# Altium footprint library IC.PcbLib: 68 footprints (part 3 of 5)
Each footprint in its own frame and in the unit in brackets; x right, y up, seen from the top. Pads: shape width x height; smd on the part's side, far side on the other; paste and mask are expansions set on the pad; w line width, h text height; cw(c..) or ccw(c..) is an arc to the next point about the centre after c.
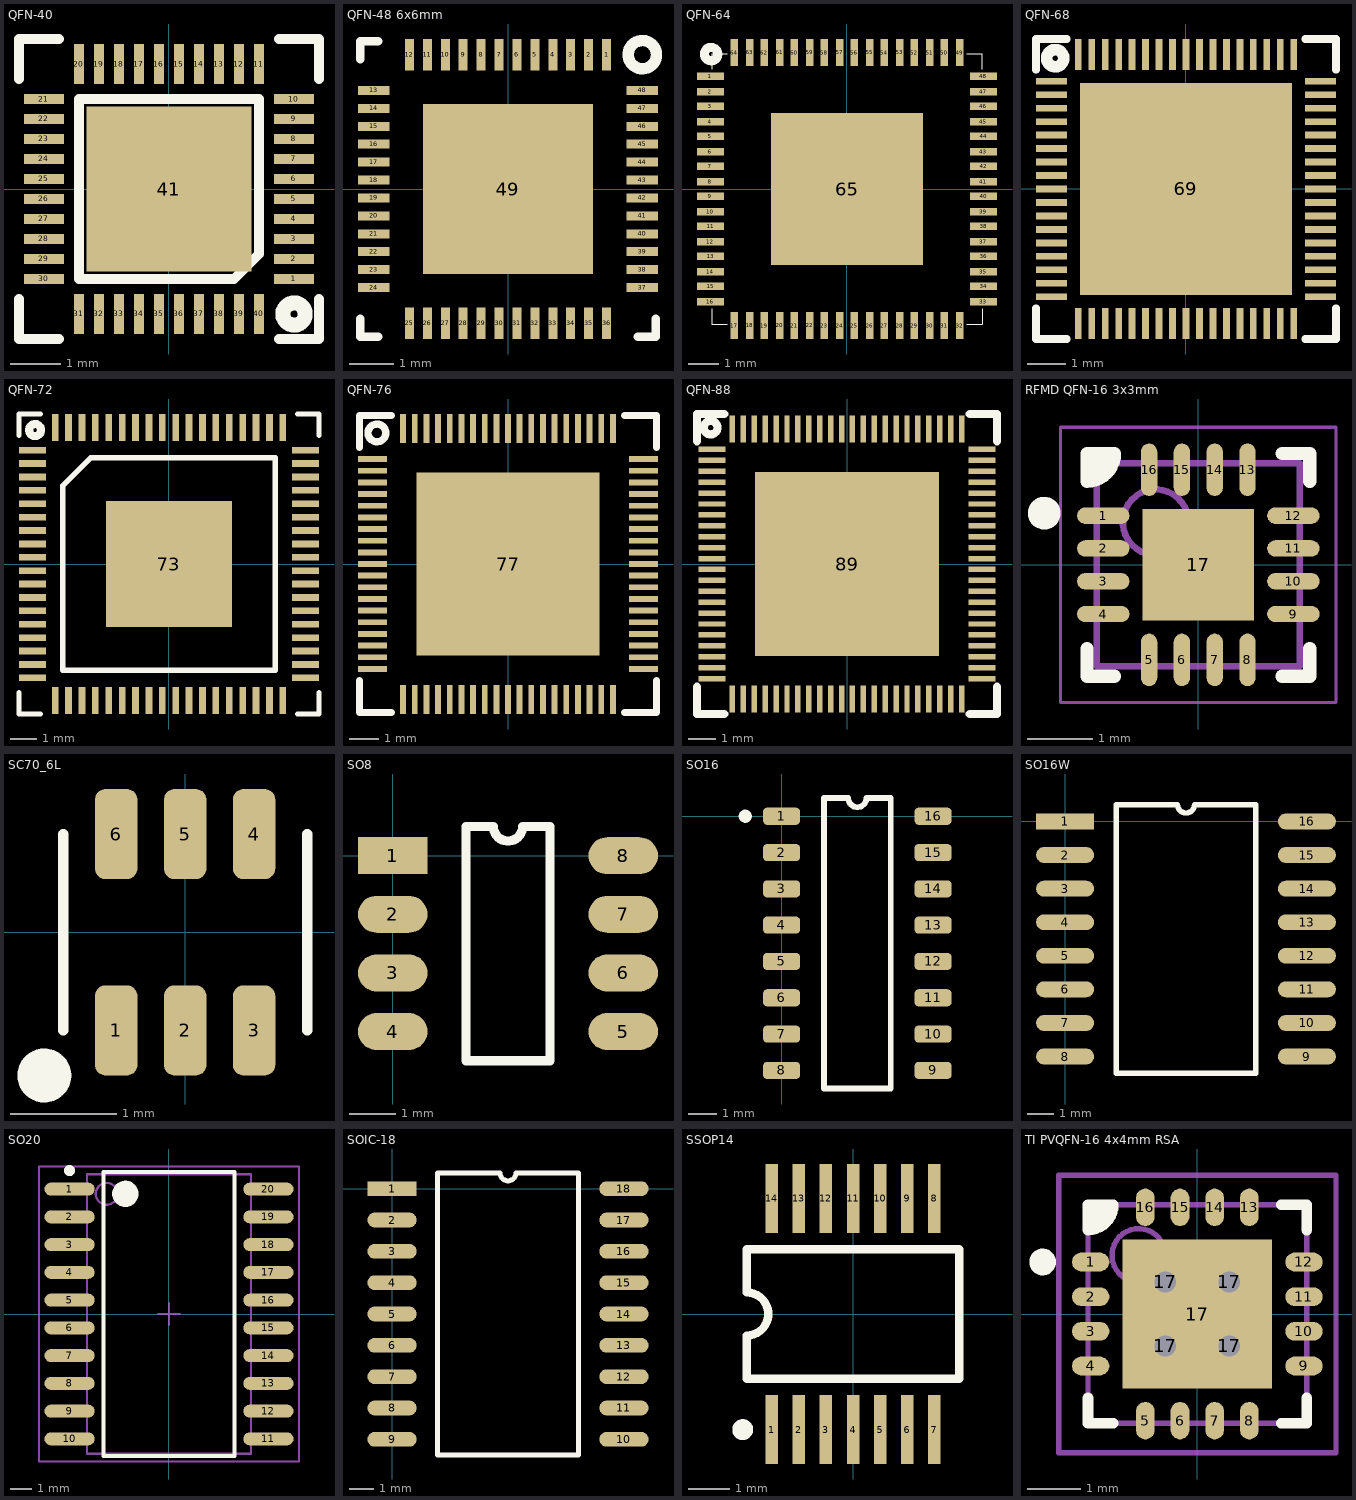
[diagram p2: the footprints below, top view; thin cyan lines are the x and y axes]

## QFN-40 [mm]
pads (41):
  rect 0.8x0.2 smd mask+0.02: 1(2.5,-1.8) 2(2.5,-1.4) 3(2.5,-1) 4(2.5,-0.6) 5(2.5,-0.2) 6(2.5,0.2) 7(2.5,0.6) 8(2.5,1) 9(2.5,1.4) 10(2.5,1.8) 21(-2.5,1.8) 22(-2.5,1.4) 23(-2.5,1) 24(-2.5,0.6) 25(-2.5,0.2) 26(-2.5,-0.2) 27(-2.5,-0.6) 28(-2.5,-1) 29(-2.5,-1.4) 30(-2.5,-1.8)
  rect 0.2x0.8 smd mask+0.02: 11(1.8,2.5) 12(1.4,2.5) 13(1,2.5) 14(0.6,2.5) 15(0.2,2.5) 16(-0.2,2.5) 17(-0.6,2.5) 18(-1,2.5) 19(-1.4,2.5) 20(-1.8,2.5) 31(-1.8,-2.5) 32(-1.4,-2.5) 33(-1,-2.5) 34(-0.6,-2.5) 35(-0.2,-2.5) 36(0.2,-2.5) 37(0.6,-2.5) 38(1,-2.5) 39(1.4,-2.5) 40(1.8,-2.5)
  rect 3.3x3.3 smd: 41(0,0)
Top Overlay:
  circle w0.3: c2.501,-2.501 r0.224
  lines w0.2: -3,-2.2 -3,-3 -2.2,-3 ; -3,2.2 -3,3 -2.2,3 ; 2.2,-3 3,-3 3,-2.2 ; 2.2,3 3,3 3,2.2 ; -1.8,-1.8 -1.8,1.8 1.8,1.8 1.8,-1.3 1.3,-1.8 -1.8,-1.8
3D body "User Library-QFN 40 5x5.STEP": height 0.73, standoff -0.02, extent -2.501,-2.501 2.501,2.501

## QFN-48 6x6mm [mm]
pads (49):
  rect 0.2x0.7 smd mask+0.03: 1(2.2,3) 2(1.8,3) 3(1.4,3) 4(1,3) 5(0.6,3) 6(0.2,3) 7(-0.2,3) 8(-0.6,3) 9(-1,3) 10(-1.4,3) 11(-1.8,3) 12(-2.2,3) 25(-2.2,-3) 26(-1.8,-3) 27(-1.4,-3) 28(-1,-3) 29(-0.6,-3) 30(-0.2,-3) 31(0.2,-3) 32(0.6,-3) 33(1,-3) 34(1.4,-3) 35(1.8,-3) 36(2.2,-3)
  rect 0.7x0.2 smd mask+0.03: 13(-3,2.2) 14(-3,1.8) 15(-3,1.4) 16(-3,1) 17(-3,0.6) 18(-3,0.2) 19(-3,-0.2) 20(-3,-0.6) 21(-3,-1) 22(-3,-1.4) 23(-3,-1.8) 24(-3,-2.2) 37(3,-2.2) 38(3,-1.8) 39(3,-1.4) 40(3,-1) 41(3,-0.6) 42(3,-0.2) 43(3,0.2) 44(3,0.6) 45(3,1) 46(3,1.4) 47(3,1.8) 48(3,2.2)
  rect 3.8x3.8 smd paste-10 mask+0.025: 49(0,0)
Top Overlay:
  circle w0.254: c3,3 r0.316
  lines w0.2: -3.3,-2.9 -3.3,-3.3 -2.9,-3.3 ; -3.3,2.9 -3.3,3.3 -2.9,3.3 ; 2.9,-3.3 3.3,-3.3 3.3,-2.9
Top Paste:
  region: -1.7,-0.1 -1.7,-1.7 -0.1,-1.7 -0.1,-0.1
  region: -1.7,1.7 -1.7,0.1 -0.1,0.1 -0.1,1.7
  region: 0.1,1.7 0.1,0.1 1.7,0.1 1.7,1.7
  region: 0.1,-0.1 0.1,-1.7 1.7,-1.7 1.7,-0.1
3D body "User Library-QFN48.STEP": height 0.85, standoff -0.02, extent -3.025,-3.025 3.015,3.015

## QFN-64 [mm]
pads (65):
  rect 0.9x0.25 smd mask+0.051: 1(-4.55,3.75) 2(-4.55,3.25) 3(-4.55,2.75) 4(-4.55,2.25) 5(-4.55,1.75) 6(-4.55,1.25) 7(-4.55,0.75) 8(-4.55,0.25) 9(-4.55,-0.25) 10(-4.55,-0.75) 11(-4.55,-1.25) 12(-4.55,-1.75) 13(-4.55,-2.25) 14(-4.55,-2.75) 15(-4.55,-3.25) 16(-4.55,-3.75) 33(4.55,-3.75) 34(4.55,-3.25) 35(4.55,-2.75) 36(4.55,-2.25) 37(4.55,-1.75) 38(4.55,-1.25) 39(4.55,-0.75) 40(4.55,-0.25) 41(4.55,0.25) 42(4.55,0.75) 43(4.55,1.25) 44(4.55,1.75) 45(4.55,2.25) 46(4.55,2.75) 47(4.55,3.25) 48(4.55,3.75)
  rect 0.25x0.9 smd mask+0.051: 17(-3.75,-4.55) 18(-3.25,-4.55) 19(-2.75,-4.55) 20(-2.25,-4.55) 21(-1.75,-4.55) 22(-1.25,-4.55) 23(-0.75,-4.55) 24(-0.25,-4.55) 25(0.25,-4.55) 26(0.75,-4.55) 27(1.25,-4.55) 28(1.75,-4.55) 29(2.25,-4.55) 30(2.75,-4.55) 31(3.25,-4.55) 32(3.75,-4.55) 49(3.75,4.55) 50(3.25,4.55) 51(2.75,4.55) 52(2.25,4.55) 53(1.75,4.55) 54(1.25,4.55) 55(0.75,4.55) 56(0.25,4.55) 57(-0.25,4.55) 58(-0.75,4.55) 59(-1.25,4.55) 60(-1.75,4.55) 61(-2.25,4.55) 62(-2.75,4.55) 63(-3.25,4.55) 64(-3.75,4.55)
  rect 5.08x5.08 smd mask+0.051: 65(0,0)
Top Overlay:
  circle w0.3: c-4.529,4.498 r0.224
  lines w0.025: -4.5,-4 -4.5,-4.5 -4,-4.5 ; -4.5,4 -4.5,4.5 -4,4.5 ; 4,-4.5 4.5,-4.5 4.5,-4 ; 4,4.5 4.5,4.5 4.5,4
3D body "User Library-QFN-64.STEP": height 0.9, standoff 0, extent -4.529,-4.522 4.491,4.498

## QFN-68 [mm]
pads (69):
  rect 0.8x0.178 smd mask+0.07: 1(-3.5,2.8) 2(-3.5,2.45) 3(-3.5,2.1) 4(-3.5,1.75) 5(-3.5,1.4) 6(-3.5,1.05) 7(-3.5,0.7) 8(-3.5,0.35) 9(-3.5,0) 10(-3.5,-0.35) 11(-3.5,-0.7) 12(-3.5,-1.05) 13(-3.5,-1.4) 14(-3.5,-1.75) 15(-3.5,-2.1) 16(-3.5,-2.45) 17(-3.5,-2.8) 35(3.5,-2.8) 36(3.5,-2.45) 37(3.5,-2.1) 38(3.5,-1.75) 39(3.5,-1.4) 40(3.5,-1.05) 41(3.5,-0.7) 42(3.5,-0.35) 43(3.5,0) 44(3.5,0.35) 45(3.5,0.7) 46(3.5,1.05) 47(3.5,1.4) 48(3.5,1.75) 49(3.5,2.1) 50(3.5,2.45) 51(3.5,2.8)
  rect 0.178x0.8 smd mask+0.07: 18(-2.8,-3.5) 19(-2.45,-3.5) 20(-2.1,-3.5) 21(-1.75,-3.5) 22(-1.4,-3.5) 23(-1.05,-3.5) 24(-0.7,-3.5) 25(-0.35,-3.5) 26(0,-3.5) 27(0.35,-3.5) 28(0.7,-3.5) 29(1.05,-3.5) 30(1.4,-3.5) 31(1.75,-3.5) 32(2.1,-3.5) 33(2.45,-3.5) 34(2.8,-3.5) 52(2.8,3.5) 53(2.45,3.5) 54(2.1,3.5) 55(1.75,3.5) 56(1.4,3.5) 57(1.05,3.5) 58(0.7,3.5) 59(0.35,3.5) 60(0,3.5) 61(-0.35,3.5) 62(-0.7,3.5) 63(-1.05,3.5) 64(-1.4,3.5) 65(-1.75,3.5) 66(-2.1,3.5) 67(-2.45,3.5) 68(-2.8,3.5)
  rect 5.5x5.5 smd mask+0.07: 69(0,0)
Top Overlay:
  circle w0.3: c-3.4,3.4 r0.224
  lines w0.2: -3.9,-3.1 -3.9,-3.9 -3.1,-3.9 ; -3.9,3.1 -3.9,3.9 -3.1,3.9 ; 3.1,-3.9 3.9,-3.9 3.9,-3.1 ; 3.1,3.9 3.9,3.9 3.9,3.1
3D body: height 0.8, standoff 0.25, extent -3.5,-3.5 3.5,3.5

## QFN-72 [mm]
pads (73):
  rect 1x0.25 smd: 1(-5.1,4.25) 2(-5.1,3.75) 3(-5.1,3.25) 4(-5.1,2.75) 5(-5.1,2.25) 6(-5.1,1.75) 7(-5.1,1.25) 8(-5.1,0.75) 9(-5.1,0.25) 10(-5.1,-0.25) 11(-5.1,-0.75) 12(-5.1,-1.25) 13(-5.1,-1.75) 14(-5.1,-2.25) 15(-5.1,-2.75) 16(-5.1,-3.25) 17(-5.1,-3.75) 18(-5.1,-4.25) 37(5.1,-4.25) 38(5.1,-3.75) 39(5.1,-3.25) 40(5.1,-2.75) 41(5.1,-2.25) 42(5.1,-1.75) 43(5.1,-1.25) 44(5.1,-0.75) 45(5.1,-0.25) 46(5.1,0.25) 47(5.1,0.75) 48(5.1,1.25) 49(5.1,1.75) 50(5.1,2.25) 51(5.1,2.75) 52(5.1,3.25) 53(5.1,3.75) 54(5.1,4.25)
  rect 0.25x1 smd: 19(-4.25,-5.1) 20(-3.75,-5.1) 21(-3.25,-5.1) 22(-2.75,-5.1) 23(-2.25,-5.1) 24(-1.75,-5.1) 25(-1.25,-5.1) 26(-0.75,-5.1) 27(-0.25,-5.1) 28(0.25,-5.1) 29(0.75,-5.1) 30(1.25,-5.1) 31(1.75,-5.1) 32(2.25,-5.1) 33(2.75,-5.1) 34(3.25,-5.1) 35(3.75,-5.1) 36(4.25,-5.1) 55(4.25,5.1) 56(3.75,5.1) 57(3.25,5.1) 58(2.75,5.1) 59(2.25,5.1) 60(1.75,5.1) 61(1.25,5.1) 62(0.75,5.1) 63(0.25,5.1) 64(-0.25,5.1) 65(-0.75,5.1) 66(-1.25,5.1) 67(-1.75,5.1) 68(-2.25,5.1) 69(-2.75,5.1) 70(-3.25,5.1) 71(-3.75,5.1) 72(-4.25,5.1)
  rect 4.7x4.7 smd: 73(0,0)
Top Overlay:
  circle w0.3: c-5,5 r0.224
  lines w0.2: -5.6,-4.8 -5.6,-5.6 -4.8,-5.6 ; -5.6,4.8 -5.6,5.6 -4.8,5.6 ; 4.8,-5.6 5.6,-5.6 5.6,-4.8 ; 4.8,5.6 5.6,5.6 5.6,4.8 ; -3.965,-3.965 -3.965,2.93 -2.93,3.965 3.965,3.965 3.965,-3.965 -3.965,-3.965
3D body: height 0.85, standoff 0.2, extent -5,-5 5,5

## QFN-76 [mm]
pads (77):
  rect 1x0.2 smd mask+0.05: 1(-4.65,3.6) 2(-4.65,3.2) 3(-4.65,2.8) 4(-4.65,2.4) 5(-4.65,2) 6(-4.65,1.6) 7(-4.65,1.2) 8(-4.65,0.8) 9(-4.65,0.4) 10(-4.65,0) 11(-4.65,-0.4) 12(-4.65,-0.8) 13(-4.65,-1.2) 14(-4.65,-1.6) 15(-4.65,-2) 16(-4.65,-2.4) 17(-4.65,-2.8) 18(-4.65,-3.2) 19(-4.65,-3.6) 39(4.65,-3.6) 40(4.65,-3.2) 41(4.65,-2.8) 42(4.65,-2.4) 43(4.65,-2) 44(4.65,-1.6) 45(4.65,-1.2) 46(4.65,-0.8) 47(4.65,-0.4) 48(4.65,0) 49(4.65,0.4) 50(4.65,0.8) 51(4.65,1.2) 52(4.65,1.6) 53(4.65,2) 54(4.65,2.4) 55(4.65,2.8) 56(4.65,3.2) 57(4.65,3.6)
  rect 0.2x1 smd mask+0.05: 20(-3.6,-4.65) 21(-3.2,-4.65) 22(-2.8,-4.65) 23(-2.4,-4.65) 24(-2,-4.65) 25(-1.6,-4.65) 26(-1.2,-4.65) 27(-0.8,-4.65) 28(-0.4,-4.65) 29(0,-4.65) 30(0.4,-4.65) 31(0.8,-4.65) 32(1.2,-4.65) 33(1.6,-4.65) 34(2,-4.65) 35(2.4,-4.65) 36(2.8,-4.65) 37(3.2,-4.65) 38(3.6,-4.65) 58(3.6,4.65) 59(3.2,4.65) 60(2.8,4.65) 61(2.4,4.65) 62(2,4.65) 63(1.6,4.65) 64(1.2,4.65) 65(0.8,4.65) 66(0.4,4.65) 67(0,4.65) 68(-0.4,4.65) 69(-0.8,4.65) 70(-1.2,4.65) 71(-1.6,4.65) 72(-2,4.65) 73(-2.4,4.65) 74(-2.8,4.65) 75(-3.2,4.65) 76(-3.6,4.65)
  rect 6.3x6.3 smd mask+0.05: 77(0,0)
Top Overlay:
  circle w0.25: c-4.5,4.5 r0.304
  lines w0.25: -5.1,-4 -5.1,-5.1 -4,-5.1 ; -5.1,4 -5.1,5.1 -4,5.1 ; 4,-5.1 5.1,-5.1 5.1,-4 ; 4,5.1 5.1,5.1 5.1,4
3D body "User Library-QFN40P900X900X100-77.STEP": height 1, standoff 0, extent -4.55,-4.55 4.55,4.55

## QFN-88 [mm]
pads (89):
  rect 1x0.2 smd mask+0.05: 1(-4.95,4.2) 2(-4.95,3.8) 3(-4.95,3.4) 4(-4.95,3) 5(-4.95,2.6) 6(-4.95,2.2) 7(-4.95,1.8) 8(-4.95,1.4) 9(-4.95,1) 10(-4.95,0.6) 11(-4.95,0.2) 12(-4.95,-0.2) 13(-4.95,-0.6) 14(-4.95,-1) 15(-4.95,-1.4) 16(-4.95,-1.8) 17(-4.95,-2.2) 18(-4.95,-2.6) 19(-4.95,-3) 20(-4.95,-3.4) 21(-4.95,-3.8) 22(-4.95,-4.2) 45(4.95,-4.2) 46(4.95,-3.8) 47(4.95,-3.4) 48(4.95,-3) 49(4.95,-2.6) 50(4.95,-2.2) 51(4.95,-1.8) 52(4.95,-1.4) 53(4.95,-1) 54(4.95,-0.6) 55(4.95,-0.2) 56(4.95,0.2) 57(4.95,0.6) 58(4.95,1) 59(4.95,1.4) 60(4.95,1.8) 61(4.95,2.2) 62(4.95,2.6) 63(4.95,3) 64(4.95,3.4) 65(4.95,3.8) 66(4.95,4.2)
  rect 0.2x1 smd mask+0.05: 23(-4.2,-4.95) 24(-3.8,-4.95) 25(-3.4,-4.95) 26(-3,-4.95) 27(-2.6,-4.95) 28(-2.2,-4.95) 29(-1.8,-4.95) 30(-1.4,-4.95) 31(-1,-4.95) 32(-0.6,-4.95) 33(-0.2,-4.95) 34(0.2,-4.95) 35(0.6,-4.95) 36(1,-4.95) 37(1.4,-4.95) 38(1.8,-4.95) 39(2.2,-4.95) 40(2.6,-4.95) 41(3,-4.95) 42(3.4,-4.95) 43(3.8,-4.95) 44(4.2,-4.95) 67(4.2,4.95) 68(3.8,4.95) 69(3.4,4.95) 70(3,4.95) 71(2.6,4.95) 72(2.2,4.95) 73(1.8,4.95) 74(1.4,4.95) 75(1,4.95) 76(0.6,4.95) 77(0.2,4.95) 78(-0.2,4.95) 79(-0.6,4.95) 80(-1,4.95) 81(-1.4,4.95) 82(-1.8,4.95) 83(-2.2,4.95) 84(-2.6,4.95) 85(-3,4.95) 86(-3.4,4.95) 87(-3.8,4.95) 88(-4.2,4.95)
  rect 6.75x6.75 smd mask+0.05: 89(0,0)
Top Overlay:
  circle w0.3: c-5,5 r0.25
  lines w0.3: -5.5,-4.5 -5.5,-5.5 -4.5,-5.5 ; -5.5,4.5 -5.5,5.5 -4.5,5.5 ; 4.5,-5.5 5.5,-5.5 5.5,-4.5 ; 4.5,5.5 5.5,5.5 5.5,4.5
3D body "User Library-QFN88.step": height 0.85, standoff -0.02, extent -5.01,-5.01 5.01,5.01

## RFMD QFN-16 3x3mm [mm] "QFN, 16-Leads, Body 3.00x3.00mm, Pitch 0.50mm, Thermal Pad 1.70x1.70mm, IPC Medium Density"
height 0.9
pads (17):
  oval 0.8x0.25 smd: 1(-1.45,0.75) 2(-1.45,0.25) 3(-1.45,-0.25) 4(-1.45,-0.75) 9(1.45,-0.75) 10(1.45,-0.25) 11(1.45,0.25) 12(1.45,0.75)
  oval 0.25x0.8 smd: 5(-0.75,-1.45) 6(-0.25,-1.45) 7(0.25,-1.45) 8(0.75,-1.45) 13(0.75,1.45) 14(0.25,1.45) 15(-0.25,1.45) 16(-0.75,1.45)
  rect 1.7x1.7 smd: 17(0,0)
Top Overlay:
  circle w0.25: c-2.35,0.788 r0.125
  region: -1.7,1.7 -1.275,1.7 -1.275,1.519 -1.519,1.275 -1.7,1.275
  lines w0.2: -1.7,-1.275 -1.7,-1.7 -1.275,-1.7 ; 1.275,-1.7 1.7,-1.7 1.7,-1.275 ; 1.275,1.7 1.7,1.7 1.7,1.275 ; -1.7,1.275 ccw(c-1.7,1.7) -1.275,1.7 -1.7,1.7 -1.7,1.275
Mechanical 13:
  circle w0.1: c-0.65,0.65 r0.5
  lines w0.1: -1.55,-1.55 1.55,-1.55 1.55,1.55 -1.55,1.55 -1.55,-1.55
Mechanical 15:
  lines w0.05: -2.1,-2.1 2.1,-2.1 2.1,2.1 -2.1,2.1 -2.1,-2.1
  lines w0.1: -0.5,0 0.5,0 ; 0,-0.5 0,0.5
3D body: height 0.9, standoff 0.01, extent -1.55,-1.55 1.55,1.55

## SC70_6L [mm]
pads (6):
  rrect50% 0.4x0.85 smd: 1(-0.65,-0.925) 3(0.65,-0.925) 4(0.65,0.925) 5(0,0.925) 6(-0.65,0.925)
  rrect50% 0.4x0.85 smd mask+0: 2(0,-0.925)
Top Overlay:
  circle w0.254: c-1.327,-1.35 r0.127
  lines w0.1: -1.15,-0.925 -1.15,0.925 ; 1.15,-0.925 1.15,0.925
3D body "User Library-sot363.step": height 1, standoff 0, extent -1.04,-1.135 1.06,1.165

## SO8 [mm]
pads (8):
  rect 1.505x0.802 smd: 1(0,0)
  oval 1.505x0.802 smd: 2(0,-1.27) 3(0,-2.54) 4(0,-3.81) 5(4.995,-3.81) 6(4.995,-2.54) 7(4.995,-1.27) 8(4.995,0)
Top Overlay:
  lines w0.2: 1.587,-4.445 3.407,-4.445 3.407,0.635 2.815,0.635 cw(c2.497,0.635) 2.18,0.635 1.587,0.635 1.587,-4.445

## SO16 [mm]
pads (16):
  rrect50% 1.3x0.6 smd: 1(0,0) 2(0,-1.27) 3(0,-2.54) 4(0,-3.81) 5(0,-5.08) 6(0,-6.35) 7(0,-7.62) 8(0,-8.89) 9(5.3,-8.89) 10(5.3,-7.62) 11(5.3,-6.35) 12(5.3,-5.08) 13(5.3,-3.81) 14(5.3,-2.54) 15(5.3,-1.27) 16(5.3,0)
Top Overlay:
  circle w0.254: c-1.27,0 r0.102
  lines w0.2: 1.485,-9.525 1.485,0.635 2.332,0.635 ccw(c2.65,0.635) 2.967,0.635 3.815,0.635 3.815,-9.525 1.485,-9.525
3D body "User Library-so16-2.step": height 1.78, standoff 0.01, extent -0.381,-9.462 5.756,0.508

## SO16W [mm]
pads (16):
  rect 2.2x0.6 smd: 1(0,0)
  oval 2.2x0.6 smd: 2(0,-1.27) 3(0,-2.54) 4(0,-3.81) 5(0,-5.08) 6(0,-6.35) 7(0,-7.62) 8(0,-8.89) 9(9.144,-8.89) 10(9.144,-7.62) 11(9.144,-6.35) 12(9.144,-5.08) 13(9.144,-3.81) 14(9.144,-2.54) 15(9.144,-1.27) 16(9.144,0)
Top Overlay:
  lines w0.2: 1.935,-9.525 1.935,0.635 4.255,0.635 ccw(c4.572,0.635) 4.889,0.635 7.209,0.635 7.209,-9.525 1.935,-9.525
3D body "User Library-SO-16W.STEP": height 2.48, standoff 0, extent -0.583,-9.61 9.727,0.72

## SO20 [mm] "SOIC, 20-Leads, Body 12.8x7.5mm, Pitch 1.27mm, IPC Medium Density"
height 2.65
pads (20):
  oval 2.3x0.6 smd: 1(-4.55,5.715) 2(-4.55,4.445) 3(-4.55,3.175) 4(-4.55,1.905) 5(-4.55,0.635) 6(-4.55,-0.635) 7(-4.55,-1.905) 8(-4.55,-3.175) 9(-4.55,-4.445) 10(-4.55,-5.715) 11(4.55,-5.715) 12(4.55,-4.445) 13(4.55,-3.175) 14(4.55,-1.905) 15(4.55,-0.635) 16(4.55,0.635) 17(4.55,1.905) 18(4.55,3.175) 19(4.55,4.445) 20(4.55,5.715)
Top Overlay:
  circle w0.25: c-4.55,6.565 r0.125
  circle w0.6: c-2,5.5 r0.3
  lines w0.2: -3,-6.5 -3,6.5 3,6.5 3,-6.5 -3,-6.5
Mechanical 13:
  circle w0.1: c-2.85,5.5 r0.5
  lines w0.1: -3.75,-6.4 -3.75,6.4 3.75,6.4 3.75,-6.4 -3.75,-6.4
Mechanical 15:
  lines w0.1: -0.5,0 0.5,0 ; 0,-0.5 0,0.5 ; -5.95,-6.75 -5.95,6.75 5.95,6.75 5.95,-6.75 -5.95,-6.75
3D body: height 2.65, standoff 0, extent -3.75,-6.4 3.75,6.4

## SOIC-18 [mm]
pads (18):
  rect 2x0.6 smd: 1(0,0)
  oval 2x0.6 smd: 2(0,-1.27) 3(0,-2.54) 4(0,-3.81) 5(0,-5.08) 6(0,-6.35) 7(0,-7.62) 8(0,-8.89) 9(0,-10.16) 10(9.4,-10.16) 11(9.4,-8.89) 12(9.4,-7.62) 13(9.4,-6.35) 14(9.4,-5.08) 15(9.4,-3.81) 16(9.4,-2.54) 17(9.4,-1.27) 18(9.4,0)
Top Overlay:
  lines w0.2: 1.835,-10.795 1.835,0.635 4.382,0.635 ccw(c4.7,0.635) 5.017,0.635 7.565,0.635 7.565,-10.795 1.835,-10.795
3D body "User Library-SOIC18-300.step": height 2.65, standoff 0, extent -0.451,-10.845 9.849,0.685

## SSOP14 [mm] "Shrink Small Outline; 14 Leads; Body Width 4.4 mm; Pitch 0.65 mm"
height 1.2
pads (14):
  rect 0.3x1.65 smd: 1(-1.95,-2.775) 2(-1.3,-2.775) 3(-0.65,-2.775) 4(0,-2.775) 5(0.65,-2.775) 6(1.3,-2.775) 7(1.95,-2.775) 8(1.95,2.775) 9(1.3,2.775) 10(0.65,2.775) 11(0,2.775) 12(-0.65,2.775) 13(-1.3,2.775) 14(-1.95,2.775)
Top Overlay:
  circle w0.25: c-2.65,-2.775 r0.125
  lines w0.2: -2.55,-1.55 -2.55,-0.517 ccw(c-2.55,0) -2.55,0.517 -2.55,1.55 2.55,1.55 2.55,-1.55 -2.55,-1.55
3D body "User Library-SSOP14-P065.STEP": height 1.73, standoff -0.08, extent -2.489,-2.997 2.511,3.003

## TI PVQFN-16 4x4mm RSA [mm] "QFN, 16-Leads, Body 4.1x4.1mm (max), Pitch 0.65mm, IPC Medium Density"
height 1
pads (21):
  oval 0.7x0.35 smd: 1(-2,0.975) 2(-2,0.325) 3(-2,-0.325) 4(-2,-0.975) 9(2,-0.975) 10(2,-0.325) 11(2,0.325) 12(2,0.975)
  oval 0.35x0.7 smd: 5(-0.975,-2) 6(-0.325,-2) 7(0.325,-2) 8(0.975,-2) 13(0.975,2) 14(0.325,2) 15(-0.325,2) 16(-0.975,2)
  round 0.8 hole 0.4 unplated: 17(-0.6,-0.6) 17(-0.6,0.6) 17(0.6,-0.6) 17(0.6,0.6)
  rect 2.8x2.8 smd: 17(0,0)
Top Overlay:
  circle w0.25: c-2.9,0.975 r0.125
  region: -2.05,2.05 -1.575,2.05 -1.575,1.854 -1.854,1.575 -2.05,1.575
  lines w0.2: -2.05,-1.575 -2.05,-2.05 -1.575,-2.05 ; 1.575,-2.05 2.05,-2.05 2.05,-1.575 ; 1.575,2.05 2.05,2.05 2.05,1.575 ; -2.05,1.575 ccw(c-2.05,2.05) -1.575,2.05 -2.05,2.05 -2.05,1.575
Mechanical 13:
  circle w0.1: c-1.1,1.1 r0.5
  lines w0.1: -2.05,-2.05 2.05,-2.05 2.05,2.05 -2.05,2.05 -2.05,-2.05
Mechanical 15:
  lines w0.1: -0.5,0 0.5,0 ; 0,-0.5 0,0.5 ; -2.6,-2.6 2.6,-2.6 2.6,2.6 -2.6,2.6 -2.6,-2.6
3D body: height 1, standoff 0.08, extent -2.05,-2.05 2.05,2.05